# Altium footprint library Connectors.PcbLib: 131 footprints (part 8 of 9)
Each footprint in its own frame and in the unit in brackets; x right, y up, seen from the top. Pads: shape width x height; smd on the part's side, far side on the other; paste and mask are expansions set on the pad; w line width, h text height; cw(c..) or ccw(c..) is an arc to the next point about the centre after c.
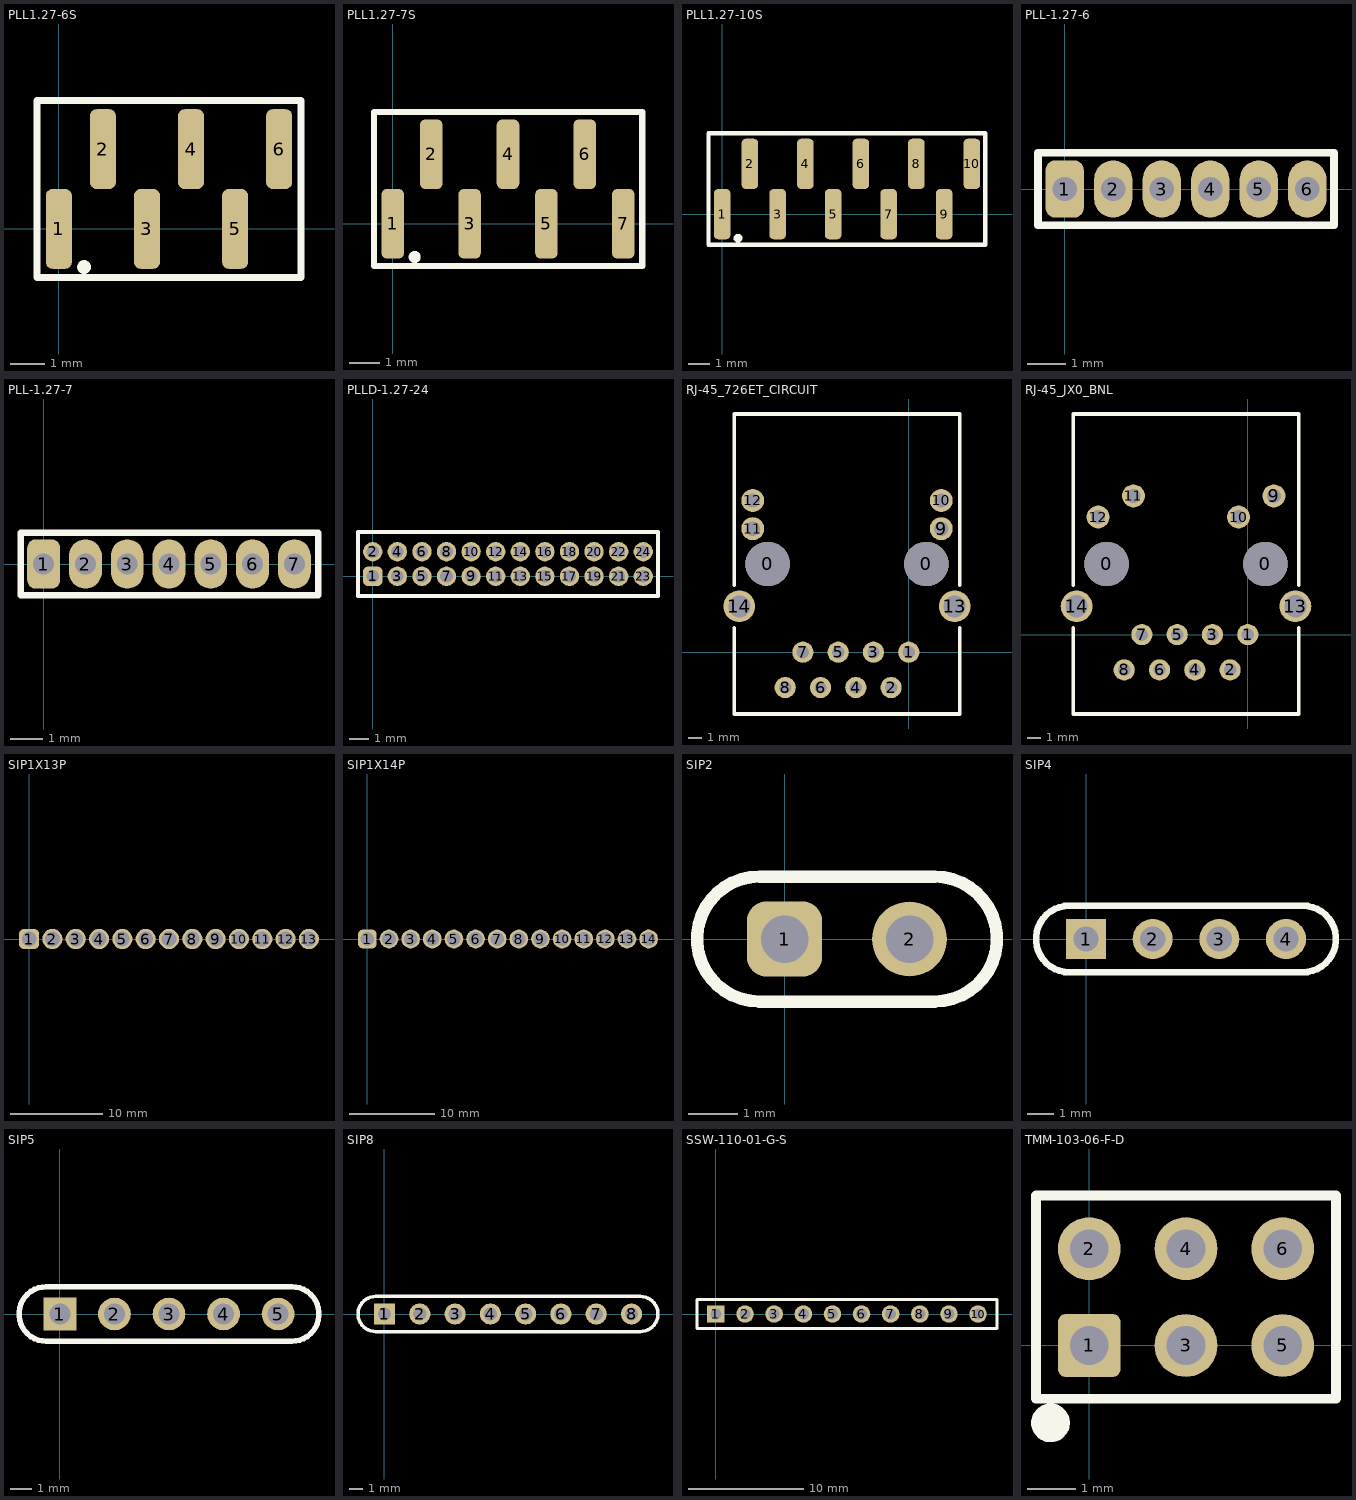
[diagram p7: the footprints below, top view; thin cyan lines are the x and y axes]

## PLL1.27-6S [mm]
pads (6):
  rrect50% 0.75x2.3 smd: 1(0,0) 2(1.27,2.3) 3(2.54,0) 4(3.81,2.3) 5(5.08,0) 6(6.35,2.3)
Top Overlay:
  circle w0.254: c0.725,-1.1 r0.071
  lines w0.2: -0.625,-1.4 -0.625,3.7 6.975,3.7 6.975,-1.4 -0.625,-1.4
Top Assembly:
  text ".Designator" at -1.823,0.937 h1
3D body "PLL1.27-6S.STEP": height 6.1, standoff 0, extent -0.625,-0.62 6.995,2.92

## PLL1.27-7S [mm]
pads (7):
  rrect50% 0.75x2.3 smd: 1(0,0) 2(1.27,2.3) 3(2.54,0) 4(3.81,2.3) 5(5.08,0) 6(6.35,2.3) 7(7.62,0)
Top Overlay:
  circle w0.254: c0.725,-1.1 r0.071
  lines w0.2: -0.625,-1.4 -0.625,3.7 8.25,3.7 8.25,-1.4 -0.625,-1.4
Top Assembly:
  text ".Designator" at -1.188,0.937 h1
3D body "PLL1.27-7S.STEP": height 6.1, standoff 0, extent -0.625,-0.62 8.265,2.92

## PLL1.27-10S [mm]
pads (10):
  rrect50% 0.75x2.3 smd: 1(0,0) 2(1.27,2.3) 3(2.54,0) 4(3.81,2.3) 5(5.08,0) 6(6.35,2.3) 7(7.62,0) 8(8.89,2.3) 9(10.16,0) 10(11.43,2.3)
Top Overlay:
  circle w0.254: c0.725,-1.1 r0.071
  lines w0.2: -0.625,-1.4 -0.625,3.7 12.05,3.7 12.05,-1.4 -0.625,-1.4
Top Assembly:
  text ".Designator" at 0.717,0.937 h1
3D body "PLL1.27-10S.STEP": height 6.1, standoff 0, extent -0.625,-0.62 12.075,2.92

## PLL-1.27-6 [mm]
pads (6):
  rrect50% 1x1.5 hole 0.635: 1(0,0)
  oval 1x1.5 hole 0.635: 2(1.27,0) 3(2.54,0) 4(3.81,0) 5(5.08,0) 6(6.35,0)
Top Overlay:
  lines w0.203: -0.7,-0.95 -0.7,0.95 7.05,0.95 7.05,-0.95 -0.7,-0.95
Top Assembly:
  text ".Designator" at -1.823,-0.333 h1

## PLL-1.27-7 [mm]
pads (7):
  rrect50% 1x1.5 hole 0.635: 1(0,0)
  oval 1x1.5 hole 0.635: 2(1.27,0) 3(2.54,0) 4(3.81,0) 5(5.08,0) 6(6.35,0) 7(7.62,0)
Top Overlay:
  lines w0.203: -0.7,-0.95 -0.7,0.95 8.35,0.95 8.35,-0.95 -0.7,-0.95
Top Assembly:
  text ".Designator" at -1.188,-0.333 h1

## PLLD-1.27-24 [mm]
pads (24):
  rrect50% 1x1 hole 0.65: 1(0,0)
  round 1 hole 0.65: 2(0,1.27) 3(1.27,0) 4(1.27,1.27) 5(2.54,0) 6(2.54,1.27) 7(3.81,0) 8(3.81,1.27) 9(5.08,0) 10(5.08,1.27) 11(6.35,0) 12(6.35,1.27) 13(7.62,0) 14(7.62,1.27) 15(8.89,0) 16(8.89,1.27) 17(10.16,0) 18(10.16,1.27) 19(11.43,0) 20(11.43,1.27) 21(12.7,0) 22(12.7,1.27) 23(13.97,0) 24(13.97,1.27)
Top Overlay:
  lines w0.203: -0.762,-1.016 14.732,-1.016 14.732,2.286 -0.762,2.286 -0.762,-1.016
Top Assembly:
  text ".Designator" at 1.987,0.302 h1
3D body "User Library-PLLD1_27-24.STEP": height 4.74, standoff -2.56, extent -0.635,-0.865 14.605,2.135

## RJ-45_726ET_CIRCUIT [mil]
pads (16):
  round 126 hole 126 unplated: 0(-400,250) 0(50,250)
  round 60 hole 35: 1(0,0) 2(-50,-100) 3(-100,0) 4(-150,-100) 5(-200,0) 6(-250,-100) 7(-300,0) 8(-350,-100)
  round 65 hole 40: 9(92,350) 10(92,430) 11(-442,350) 12(-442,430)
  round 90 hole 62: 13(130,130) 14(-480,130)
Top Overlay:
  lines w10: -495,70 -495,-175 145,-175 145,70 ; -495,190 -495,675 145,675 145,190
Top Assembly:
  text ".Designator" at 21.79,236.88 h39.37
3D body "c-6605761-1-c-3d.stp": height 550, standoff -145, extent -497.36,-160.38 147.64,676.12

## RJ-45_JX0_BNL [mil]
pads (16):
  round 126 hole 126 unplated: 0(-400,200) 0(50,200)
  round 60 hole 35: 1(0,0) 2(-50,-100) 3(-100,0) 4(-150,-100) 5(-200,0) 6(-250,-100) 7(-300,0) 8(-350,-100)
  round 65 hole 40: 9(74,393) 10(-26,333) 11(-324,393) 12(-424,333)
  round 90 hole 63: 13(135,80) 14(-485,80)
Top Overlay:
  lines w10: -495,20 -495,-225 145,-225 145,20 ; -495,140 -495,625 145,625 145,140
Top Assembly:
  text ".Designator" at 21.79,186.88 h39.37

## SIP1X13P [mm]
pads (13):
  rrect50% 2.2x2.2 hole 1.6: 1(0,0)
  round 2.2 hole 1.6: 2(2.54,0) 3(5.08,0) 4(7.62,0) 5(10.16,0) 6(12.7,0) 7(15.24,0) 8(17.78,0) 9(20.32,0) 10(22.86,0) 11(25.4,0) 12(27.94,0) 13(30.48,0)
Top Assembly:
  text ".Designator" at 20.233,-0.328 h1
3D body "Samtec-HSS-113-G-38.step": height 2.55, standoff -6.34, extent -1.275,-1.265 31.745,1.275

## SIP1X14P [mm]
pads (14):
  rrect50% 2.2x2.2 hole 1.6: 1(0,0)
  round 2.2 hole 1.6: 2(2.54,0) 3(5.08,0) 4(7.62,0) 5(10.16,0) 6(12.7,0) 7(15.24,0) 8(17.78,0) 9(20.32,0) 10(22.86,0) 11(25.4,0) 12(27.94,0) 13(30.48,0) 14(33.02,0)
Top Assembly:
  text ".Designator" at 21.508,-0.333 h1

## SIP2 [mil]
pads (2):
  rrect50% 60x60 hole 38: 1(0,0)
  round 60 hole 38: 2(100,0)
Top Overlay:
  lines w10: -20,-50 cw(c-20,0) -20,50 120,50 cw(c120,0) 120,-50 -20,-50
Top Assembly:
  text ".Designator" at 246.79,-13.12 h39.37
3D body "pin_header_aw_108_02-t.stp": height 370.08, standoff -118.11, extent -49.8,-49.21 146.26,49.21

## SIP4 [mil]
pads (4):
  rect 60x60 hole 38: 1(0,0)
  round 60 hole 38: 2(100,0) 3(200,0) 4(300,0)
Top Overlay:
  lines w10: -25,-50 cw(c-25,0) -25,50 325,50 cw(c325,0) 325,-50 -25,-50
Top Assembly:
  text ".Designator" at 346.79,-13.12 h39.37
3D body "pin_header_aw_108_02-t.stp": height 370.08, standoff -118.11, extent 150.2,-49.21 346.26,49.21
3D body "pin_header_aw_108_02-t.stp": height 370.08, standoff -118.11, extent -49.8,-49.21 146.26,49.21

## SIP5 [mil]
pads (5):
  rect 60x60 hole 38: 1(0,0)
  round 60 hole 38: 2(100,0) 3(200,0) 4(300,0) 5(400,0)
Top Overlay:
  lines w10: -25,-50 cw(c-25,0) -25,50 425,50 cw(c425,0) 425,-50 -25,-50
Top Assembly:
  text ".Designator" at 396.79,-13.12 h39.37
3D body "m20-9770542_asm.stp": height 329.13, standoff -122.83, extent -49.21,-50.2 450.79,49.8

## SIP8 [mil]
pads (8):
  rect 60x60 hole 38: 1(0,0)
  round 60 hole 38: 2(100,0) 3(200,0) 4(300,0) 5(400,0) 6(500,0) 7(600,0) 8(700,0)
Top Overlay:
  lines w10: -25,-50 cw(c-25,0) -25,50 725,50 cw(c725,0) 725,-50 -25,-50
Top Assembly:
  text ".Designator" at 546.79,-13.12 h39.37

## SSW-110-01-G-S [mil]
pads (10):
  rect 60x60 hole 38: 1(0,0)
  round 60 hole 38: 2(100,0) 3(200,0) 4(300,0) 5(400,0) 6(500,0) 7(600,0) 8(700,0) 9(800,0) 10(900,0)
Top Overlay:
  lines w10: -65,-50 965,-50 965,50 -65,50 -65,-50
Top Assembly:
  text ".Designator" at 255.97,-13.12 h39.37
3D body "SSW-110-01-G-S.stp": height 335, standoff -104, extent -60.35,-47.5 959.65,47.5

## TMM-103-06-F-D [mm]
pads (6):
  rrect25% 1.3x1.3 hole 0.8: 1(0,0)
  round 1.3 hole 0.8: 2(0,2) 3(2,0) 4(2,2) 5(4,0) 6(4,2)
Top Overlay:
  circle w0.4: c-0.8,-1.6 r0.2
  lines w0.2: -1.1,-1.1 -1.1,3.1 5.1,3.1 5.1,-1.1 -1.1,-1.1
Top Assembly:
  text ".Designator" at -2.998,0.667 h1
3D body "Samtec-TMM-103-06-F-D.STEP": height 4.7, standoff -4.88, extent -1,-0.95 5,2.987